# Altium footprint library CHIP.PcbLib: 86 footprints (part 1 of 6)
Each footprint in its own frame and in the unit in brackets; x right, y up, seen from the top. Pads: shape width x height; smd on the part's side, far side on the other; paste and mask are expansions set on the pad; w line width, h text height; cw(c..) or ccw(c..) is an arc to the next point about the centre after c.
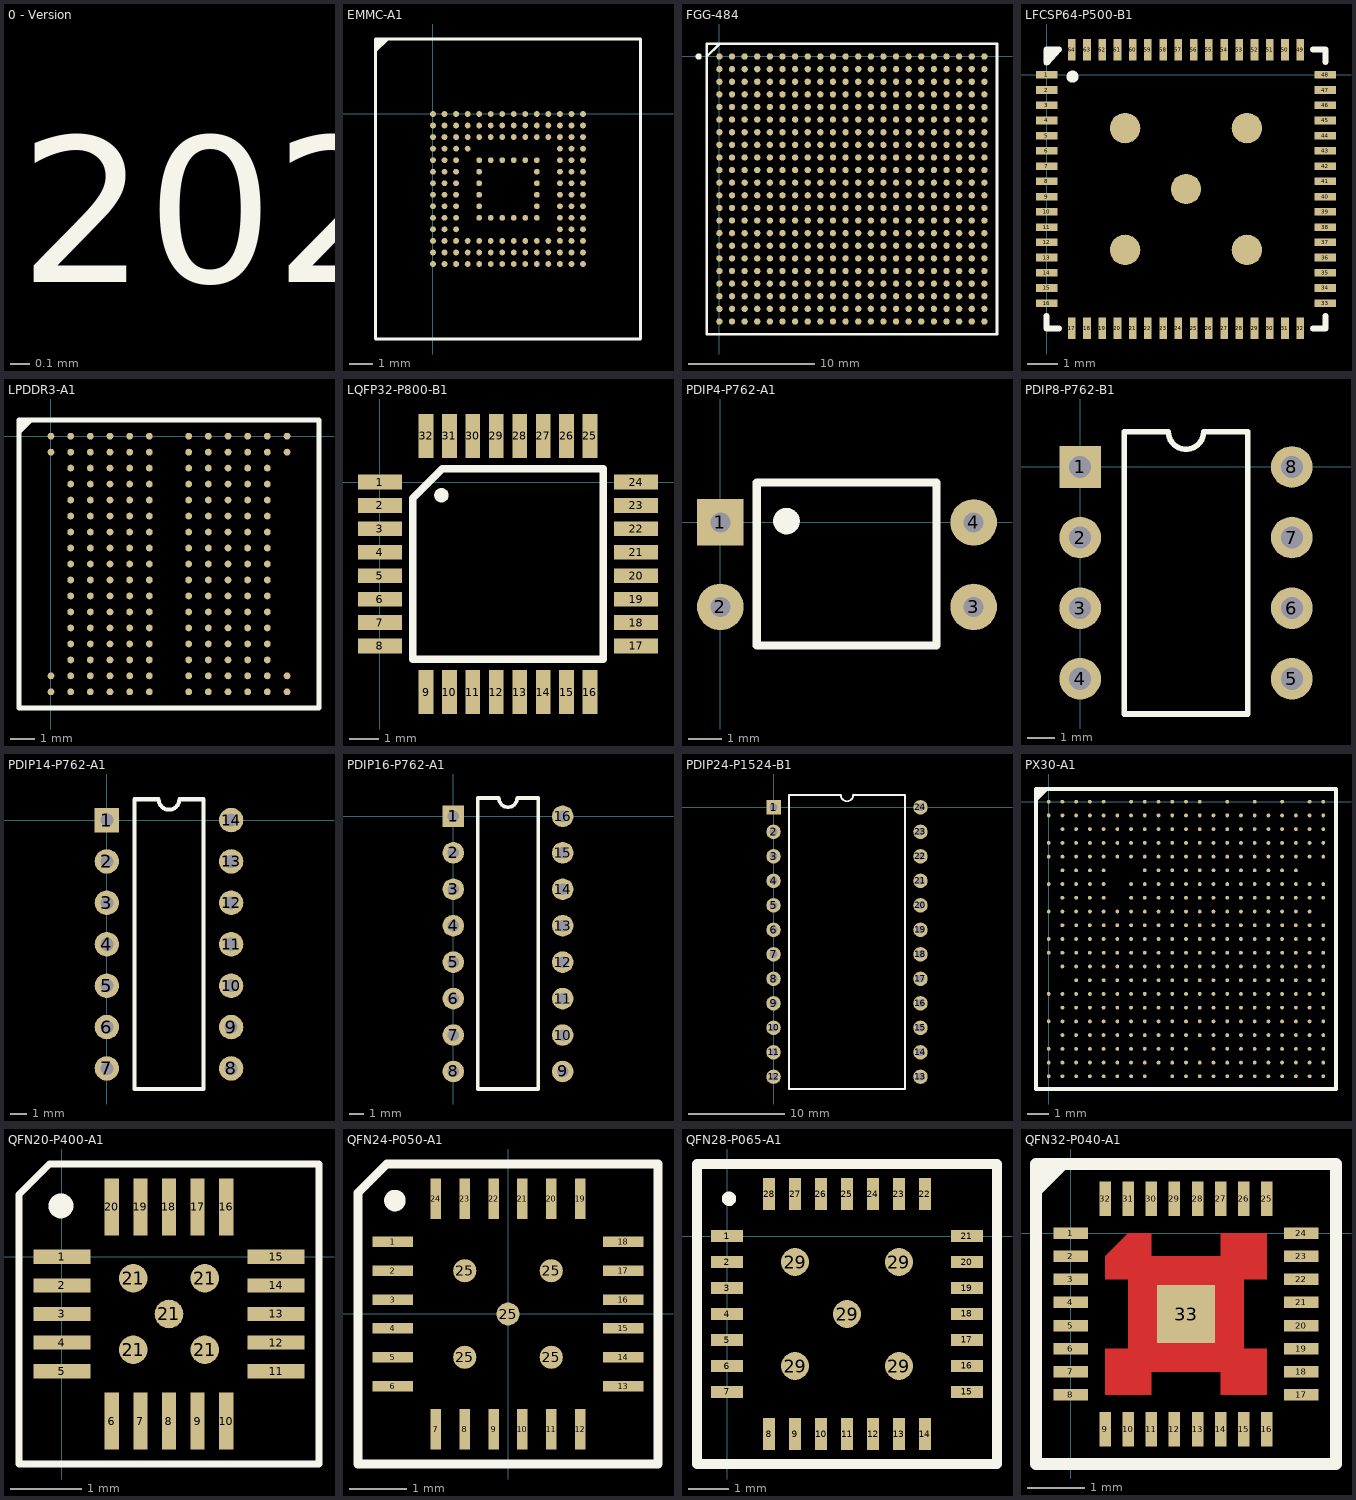
[diagram p0: the footprints below, top view; thin cyan lines are the x and y axes]

## 0 - Version [mm]
Top Overlay:
  text "CHIP / v1.0.4 / 2022/04/20" at -1263.5,-1267.925 h1.52

## EMMC-A1 [mm]
pads (153):
  round 0.25 smd mask+0.05: A1(0,0) A2(0.5,0) A3(1,0) A4(1.5,0) A5(2,0) A6(2.5,0) A7(3,0) A8(3.5,0) A9(4,0) A10(4.5,0) A11(5,0) A12(5.5,0) A13(6,0) A14(6.5,0) B1(0,-0.5) B2(0.5,-0.5) B3(1,-0.5) B4(1.5,-0.5) B5(2,-0.5) B6(2.5,-0.5) B7(3,-0.5) B8(3.5,-0.5) B9(4,-0.5) B10(4.5,-0.5) B11(5,-0.5) B12(5.5,-0.5) B13(6,-0.5) B14(6.5,-0.5) C1(0,-1) C2(0.5,-1) C3(1,-1) C4(1.5,-1) C5(2,-1) C6(2.5,-1) C7(3,-1) C8(3.5,-1) C9(4,-1) C10(4.5,-1) C11(5,-1) C12(5.5,-1) C13(6,-1) C14(6.5,-1) D1(0,-1.5) D2(0.5,-1.5) D3(1,-1.5) D4(1.5,-1.5) D12(5.5,-1.5) D13(6,-1.5) D14(6.5,-1.5) E1(0,-2) E2(0.5,-2) E3(1,-2) E5(2,-2) E6(2.5,-2) E7(3,-2) E8(3.5,-2) E9(4,-2) E10(4.5,-2) E12(5.5,-2) E13(6,-2) E14(6.5,-2) F1(0,-2.5) F2(0.5,-2.5) F3(1,-2.5) F5(2,-2.5) F10(4.5,-2.5) F12(5.5,-2.5) F13(6,-2.5) F14(6.5,-2.5) G1(0,-3) G2(0.5,-3) G3(1,-3) G5(2,-3) G10(4.5,-3) G12(5.5,-3) G13(6,-3) G14(6.5,-3) H1(0,-3.5) H2(0.5,-3.5) H3(1,-3.5) H5(2,-3.5) H10(4.5,-3.5) H12(5.5,-3.5) H13(6,-3.5) H14(6.5,-3.5) J1(0,-4) J2(0.5,-4) J3(1,-4) J5(2,-4) J10(4.5,-4) J12(5.5,-4) J13(6,-4) J14(6.5,-4) K1(0,-4.5) K2(0.5,-4.5) K3(1,-4.5) K5(2,-4.5) K6(2.5,-4.5) K7(3,-4.5) K8(3.5,-4.5) K9(4,-4.5) K10(4.5,-4.5) K12(5.5,-4.5) K13(6,-4.5) K14(6.5,-4.5) L1(0,-5) L2(0.5,-5) L3(1,-5) L12(5.5,-5) L13(6,-5) L14(6.5,-5) M1(0,-5.5) M2(0.5,-5.5) M3(1,-5.5) M4(1.5,-5.5) M5(2,-5.5) M6(2.5,-5.5) M7(3,-5.5) M8(3.5,-5.5) M9(4,-5.5) M10(4.5,-5.5) M11(5,-5.5) M12(5.5,-5.5) M13(6,-5.5) M14(6.5,-5.5) N1(0,-6) N2(0.5,-6) N3(1,-6) N4(1.5,-6) N5(2,-6) N6(2.5,-6) N7(3,-6) N8(3.5,-6) N9(4,-6) N10(4.5,-6) N11(5,-6) N12(5.5,-6) N13(6,-6) N14(6.5,-6) P1(0,-6.5) P2(0.5,-6.5) P3(1,-6.5) P4(1.5,-6.5) P5(2,-6.5) P6(2.5,-6.5) P7(3,-6.5) P8(3.5,-6.5) P9(4,-6.5) P10(4.5,-6.5) P11(5,-6.5) P12(5.5,-6.5) P13(6,-6.5) P14(6.5,-6.5)
Top Overlay:
  region: -2.5,3.25 -1.9,3.25 -2.5,2.65
  lines w0.127: -2.5,-9.75 -2.5,2.625 -2.5,2.75 -2.5,2.875 -2.5,3 -2.5,3.125 -2.5,3.25 -2.375,3.25 -2.25,3.25 -2.125,3.25 -2,3.25 -1.875,3.25 9,3.25 9,-9.75 -2.5,-9.75

## FGG-484 [mm]
pads (484):
  round 0.5 smd: A1(0.001,-0.001) A2(1,-0.001) A3(2,-0.001) A4(3,-0.001) A5(4,-0.001) A6(5,-0.001) A7(6,-0.001) A8(7.001,-0.001) A9(8.001,-0.001) A10(9.001,-0.001) A11(10.001,-0.001) A12(11.001,-0.001) A13(12.001,-0.001) A14(13,-0.001) A15(14,-0.001) A16(15,-0.001) A17(16,-0.001) A18(17,-0.001) A19(18,-0.001) A20(19.001,-0.001) A21(20.001,-0.001) A22(21.001,-0.001) AA1(0.001,-20.001) AA2(1,-20.001) AA3(2,-20.001) AA4(3,-20.001) AA5(4,-20.001) AA6(5,-20.001) AA7(6,-20.001) AA8(7.001,-20.001) AA9(8.001,-20.001) AA10(9.001,-20.001) AA11(10.001,-20.001) AA12(11.001,-20.001) AA13(12.001,-20.001) AA14(13,-20.001) AA15(14,-20.001) AA16(15,-20.001) AA17(16,-20.001) AA18(17,-20.001) AA19(18,-20.001) AA20(19.001,-20.001) AA21(20.001,-20.001) AA22(21.001,-20.001) AB1(0.001,-21.001) AB2(1,-21.001) AB3(2,-21.001) AB4(3,-21.001) AB5(4,-21.001) AB6(5,-21.001) AB7(6,-21.001) AB8(7.001,-21.001) AB9(8.001,-21.001) AB10(9.001,-21.001) AB11(10.001,-21.001) AB12(11.001,-21.001) AB13(12.001,-21.001) AB14(13,-21.001) AB15(14,-21.001) AB16(15,-21.001) AB17(16,-21.001) AB18(17,-21.001) AB19(18,-21.001) AB20(19.001,-21.001) AB21(20.001,-21.001) AB22(21.001,-21.001) B1(0.001,-1.001) B2(1,-1.001) B3(2,-1.001) B4(3,-1.001) B5(4,-1.001) B6(5,-1.001) B7(6,-1.001) B8(7.001,-1.001) B9(8.001,-1.001) B10(9.001,-1.001) B11(10.001,-1.001) B12(11.001,-1.001) B13(12.001,-1.001) B14(13,-1.001) B15(14,-1.001) B16(15,-1.001) B17(16,-1.001) B18(17,-1.001) B19(18,-1.001) B20(19.001,-1.001) B21(20.001,-1.001) B22(21.001,-1.001) C1(0.001,-2.001) C2(1,-2.001) C3(2,-2.001) C4(3,-2.001) C5(4,-2.001) C6(5,-2.001) C7(6,-2.001) C8(7.001,-2.001) C9(8.001,-2.001) C10(9.001,-2.001) C11(10.001,-2.001) C12(11.001,-2.001) C13(12.001,-2.001) C14(13,-2.001) C15(14,-2.001) C16(15,-2.001) C17(16,-2.001) C18(17,-2.001) C19(18,-2.001) C20(19.001,-2.001) C21(20.001,-2.001) C22(21.001,-2.001) D1(0.001,-3.001) D2(1,-3.001) D3(2,-3.001) D4(3,-3.001) D5(4,-3.001) D6(5,-3.001) D7(6,-3.001) D8(7.001,-3.001) D9(8.001,-3.001) D10(9.001,-3.001) D11(10.001,-3.001) D12(11.001,-3.001) D13(12.001,-3.001) D14(13,-3.001) D15(14,-3.001) D16(15,-3.001) D17(16,-3.001) D18(17,-3.001) D19(18,-3.001) D20(19.001,-3.001) D21(20.001,-3.001) D22(21.001,-3.001) E1(0.001,-4.001) E2(1,-4.001) E3(2,-4.001) E4(3,-4.001) E5(4,-4.001) E6(5,-4.001) E7(6,-4.001) E8(7.001,-4.001) E9(8.001,-4.001) E10(9.001,-4.001) E11(10.001,-4.001) E12(11.001,-4.001) E13(12.001,-4.001) E14(13,-4.001) E15(14,-4.001) E16(15,-4.001) E17(16,-4.001) E18(17,-4.001) E19(18,-4.001) E20(19.001,-4.001) E21(20.001,-4.001) E22(21.001,-4.001) F1(0.001,-5.001) F2(1,-5.001) F3(2,-5.001) F4(3,-5.001) F5(4,-5.001) F6(5,-5.001) F7(6,-5.001) F8(7.001,-5.001) F9(8.001,-5.001) F10(9.001,-5.001) F11(10.001,-5.001) F12(11.001,-5.001) F13(12.001,-5.001) F14(13,-5.001) F15(14,-5.001) F16(15,-5.001) F17(16,-5.001) F18(17,-5.001) F19(18,-5.001) F20(19.001,-5.001) F21(20.001,-5.001) F22(21.001,-5.001) G1(0.001,-6.001) G2(1,-6.001) G3(2,-6.001) G4(3,-6.001) G5(4,-6.001) G6(5,-6.001) G7(6,-6.001) G8(7.001,-6.001) G9(8.001,-6.001) G10(9.001,-6.001) G11(10.001,-6.001) G12(11.001,-6.001) G13(12.001,-6.001) G14(13,-6.001) G15(14,-6.001) G16(15,-6.001) G17(16,-6.001) G18(17,-6.001) G19(18,-6.001) G20(19.001,-6.001) G21(20.001,-6.001) G22(21.001,-6.001) H1(0.001,-7.001) H2(1,-7.001) H3(2,-7.001) H4(3,-7.001) H5(4,-7.001) H6(5,-7.001) H7(6,-7.001) H8(7.001,-7.001) H9(8.001,-7.001) H10(9.001,-7.001) H11(10.001,-7.001) H12(11.001,-7.001) H13(12.001,-7.001) H14(13,-7.001) H15(14,-7.001) H16(15,-7.001) H17(16,-7.001) H18(17,-7.001) H19(18,-7.001) H20(19.001,-7.001) H21(20.001,-7.001) H22(21.001,-7.001) J1(0.001,-8.001) J2(1,-8.001) J3(2,-8.001) J4(3,-8.001) J5(4,-8.001) J6(5,-8.001) J7(6,-8.001) J8(7.001,-8.001) J9(8.001,-8.001) J10(9.001,-8.001) J11(10.001,-8.001) J12(11.001,-8.001) J13(12.001,-8.001) J14(13,-8.001) J15(14,-8.001) J16(15,-8.001) J17(16,-8.001) J18(17,-8.001) J19(18,-8.001) J20(19.001,-8.001) J21(20.001,-8.001) J22(21.001,-8.001) K1(0.001,-9.001) K2(1,-9.001) K3(2,-9.001) K4(3,-9.001) K5(4,-9.001) K6(5,-9.001) K7(6,-9.001) K8(7.001,-9.001) K9(8.001,-9.001) K10(9.001,-9.001) K11(10.001,-9.001) K12(11.001,-9.001) K13(12.001,-9.001) K14(13,-9.001) K15(14,-9.001) K16(15,-9.001) K17(16,-9.001) K18(17,-9.001) K19(18,-9.001) K20(19.001,-9.001) K21(20.001,-9.001) K22(21.001,-9.001) L1(0.001,-10.001) L2(1,-10.001) L3(2,-10.001) L4(3,-10.001) L5(4,-10.001) L6(5,-10.001) L7(6,-10.001) L8(7.001,-10.001) L9(8.001,-10.001) L10(9.001,-10.001) L11(10.001,-10.001) L12(11.001,-10.001) L13(12.001,-10.001) L14(13,-10.001) L15(14,-10.001) L16(15,-10.001) L17(16,-10.001) L18(17,-10.001) L19(18,-10.001) L20(19.001,-10.001) L21(20.001,-10.001) L22(21.001,-10.001) M1(0.001,-11.001) M2(1,-11.001) M3(2,-11.001) M4(3,-11.001) M5(4,-11.001) M6(5,-11.001) M7(6,-11.001) M8(7.001,-11.001) M9(8.001,-11.001) M10(9.001,-11.001) M11(10.001,-11.001) M12(11.001,-11.001) M13(12.001,-11.001) M14(13,-11.001) M15(14,-11.001) M16(15,-11.001) M17(16,-11.001) M18(17,-11.001) M19(18,-11.001) M20(19.001,-11.001) M21(20.001,-11.001) M22(21.001,-11.001) N1(0.001,-12.001) N2(1,-12.001) N3(2,-12.001) N4(3,-12.001) N5(4,-12.001) N6(5,-12.001) N7(6,-12.001) N8(7.001,-12.001) N9(8.001,-12.001) N10(9.001,-12.001) N11(10.001,-12.001) N12(11.001,-12.001) N13(12.001,-12.001) N14(13,-12.001) N15(14,-12.001) N16(15,-12.001) N17(16,-12.001) N18(17,-12.001) N19(18,-12.001) N20(19.001,-12.001) N21(20.001,-12.001) N22(21.001,-12.001) P1(0.001,-13.001) P2(1,-13.001) P3(2,-13.001) P4(3,-13.001) P5(4,-13.001) P6(5,-13.001) P7(6,-13.001) P8(7.001,-13.001) P9(8.001,-13.001) P10(9.001,-13.001) P11(10.001,-13.001) P12(11.001,-13.001) P13(12.001,-13.001) P14(13,-13.001) P15(14,-13.001) P16(15,-13.001) P17(16,-13.001) P18(17,-13.001) P19(18,-13.001) P20(19.001,-13.001) P21(20.001,-13.001) P22(21.001,-13.001) R1(0.001,-14.001) R2(1,-14.001) R3(2,-14.001) R4(3,-14.001) R5(4,-14.001) R6(5,-14.001) R7(6,-14.001) R8(7.001,-14.001) R9(8.001,-14.001) R10(9.001,-14.001) R11(10.001,-14.001) R12(11.001,-14.001) R13(12.001,-14.001) R14(13,-14.001) R15(14,-14.001) R16(15,-14.001) R17(16,-14.001) R18(17,-14.001) R19(18,-14.001) R20(19.001,-14.001) R21(20.001,-14.001) R22(21.001,-14.001) T1(0.001,-15.001) T2(1,-15.001) T3(2,-15.001) T4(3,-15.001) T5(4,-15.001) T6(5,-15.001) T7(6,-15.001) T8(7.001,-15.001) T9(8.001,-15.001) T10(9.001,-15.001) T11(10.001,-15.001) T12(11.001,-15.001) T13(12.001,-15.001) T14(13,-15.001) T15(14,-15.001) T16(15,-15.001) T17(16,-15.001) T18(17,-15.001) T19(18,-15.001) T20(19.001,-15.001) T21(20.001,-15.001) T22(21.001,-15.001) U1(0.001,-16.001) U2(1,-16.001) U3(2,-16.001) U4(3,-16.001) U5(4,-16.001) U6(5,-16.001) U7(6,-16.001) U8(7.001,-16.001) U9(8.001,-16.001) U10(9.001,-16.001) U11(10.001,-16.001) U12(11.001,-16.001) U13(12.001,-16.001) U14(13,-16.001) U15(14,-16.001) U16(15,-16.001) U17(16,-16.001) U18(17,-16.001) U19(18,-16.001) U20(19.001,-16.001) U21(20.001,-16.001) U22(21.001,-16.001) V1(0.001,-17.001) V2(1,-17.001) V3(2,-17.001) V4(3,-17.001) V5(4,-17.001) V6(5,-17.001) V7(6,-17.001) V8(7.001,-17.001) V9(8.001,-17.001) V10(9.001,-17.001) V11(10.001,-17.001) V12(11.001,-17.001) V13(12.001,-17.001) V14(13,-17.001) V15(14,-17.001) V16(15,-17.001) V17(16,-17.001) V18(17,-17.001) V19(18,-17.001) V20(19.001,-17.001) V21(20.001,-17.001) V22(21.001,-17.001) W1(0.001,-18.001) W2(1,-18.001) W3(2,-18.001) W4(3,-18.001) W5(4,-18.001) W6(5,-18.001) W7(6,-18.001) W8(7.001,-18.001) W9(8.001,-18.001) W10(9.001,-18.001) W11(10.001,-18.001) W12(11.001,-18.001) W13(12.001,-18.001) W14(13,-18.001) W15(14,-18.001) W16(15,-18.001) W17(16,-18.001) W18(17,-18.001) W19(18,-18.001) W20(19.001,-18.001) W21(20.001,-18.001) W22(21.001,-18.001) Y1(0.001,-19.001) Y2(1,-19.001) Y3(2,-19.001) Y4(3,-19.001) Y5(4,-19.001) Y6(5,-19.001) Y7(6,-19.001) Y8(7.001,-19.001) Y9(8.001,-19.001) Y10(9.001,-19.001) Y11(10.001,-19.001) Y12(11.001,-19.001) Y13(12.001,-19.001) Y14(13,-19.001) Y15(14,-19.001) Y16(15,-19.001) Y17(16,-19.001) Y18(17,-19.001) Y19(18,-19.001) Y20(19.001,-19.001) Y21(20.001,-19.001) Y22(21.001,-19.001)
Top Overlay:
  circle w0.25: c-1.65,-0.001 r0.125
  lines w0.2: -0.999,-0.001 0.001,0.999 ; -0.999,-22.001 22.001,-22.001 22.001,0.999 -0.999,0.999 -0.999,-22.001

## LFCSP64-P500-B1 [mm]
height 0.85
pads (70):
  rect 0.7x0.25 smd: 1(0,0) 2(0,-0.5) 3(0,-1) 4(0,-1.5) 5(0,-2) 6(0,-2.5) 7(0,-3) 8(0,-3.5) 9(0,-4) 10(0,-4.5) 11(0,-5) 12(0,-5.5) 13(0,-6) 14(0,-6.5) 15(0,-7) 16(0,-7.5) 33(9.15,-7.5) 34(9.15,-7) 35(9.15,-6.5) 36(9.15,-6) 37(9.15,-5.5) 38(9.15,-5) 39(9.15,-4.5) 40(9.15,-4) 41(9.15,-3.5) 42(9.15,-3) 43(9.15,-2.5) 44(9.15,-2) 45(9.15,-1.5) 46(9.15,-1) 47(9.15,-0.5) 48(9.15,0)
  rect 0.25x0.7 smd: 17(0.825,-8.325) 18(1.325,-8.325) 19(1.825,-8.325) 20(2.325,-8.325) 21(2.825,-8.325) 22(3.325,-8.325) 23(3.825,-8.325) 24(4.325,-8.325) 25(4.825,-8.325) 26(5.325,-8.325) 27(5.825,-8.325) 28(6.325,-8.325) 29(6.825,-8.325) 30(7.325,-8.325) 31(7.825,-8.325) 32(8.325,-8.325) 49(8.325,0.825) 50(7.825,0.825) 51(7.325,0.825) 52(6.825,0.825) 53(6.325,0.825) 54(5.825,0.825) 55(5.325,0.825) 56(4.825,0.825) 57(4.325,0.825) 58(3.825,0.825) 59(3.325,0.825) 60(2.825,0.825) 61(2.325,0.825) 62(1.825,0.825) 63(1.325,0.825) 64(0.825,0.825)
  round 0.4 on Top Overlay paste+0: ""(0.85,-0.06)
  round 1 smd: ""(2.575,-5.75) ""(2.575,-1.75) ""(4.575,-3.75) ""(6.575,-5.75) ""(6.575,-1.75)
Top Overlay:
  lines w0.2: 0,-7.925 0,-8.325 0.4,-8.325 ; 0,0.825 0,0.4 0.4,0.83 0,0.83 ; 0.03,0.72 0.24,0.72 ; 8.75,-8.325 9.15,-8.325 9.15,-7.925 ; 8.75,0.825 9.15,0.825 9.15,0.425
3D body "AD5755-STEP.STEP": height 0.83, standoff -0.02, extent 0.075,-8.246 9.075,0.755

## LPDDR3-A1 [mm]
pads (178):
  round 0.275 smd mask+0.05: A1(0,0) A2(0.8,0) A3(1.6,0) A4(2.4,0) A5(3.2,0) A6(4,0) A8(5.6,0) A9(6.4,0) A10(7.2,0) A11(8,0) A12(8.8,0) A13(9.6,0) B1(0,-0.65) B2(0.8,-0.65) B3(1.6,-0.65) B4(2.4,-0.65) B5(3.2,-0.65) B6(4,-0.65) B8(5.6,-0.65) B9(6.4,-0.65) B10(7.2,-0.65) B11(8,-0.65) B12(8.8,-0.65) B13(9.6,-0.65) C2(0.8,-1.3) C3(1.6,-1.3) C4(2.4,-1.3) C5(3.2,-1.3) C6(4,-1.3) C8(5.6,-1.3) C9(6.4,-1.3) C10(7.2,-1.3) C11(8,-1.3) C12(8.8,-1.3) D2(0.8,-1.95) D3(1.6,-1.95) D4(2.4,-1.95) D5(3.2,-1.95) D6(4,-1.95) D8(5.6,-1.95) D9(6.4,-1.95) D10(7.2,-1.95) D11(8,-1.95) D12(8.8,-1.95) E2(0.8,-2.6) E3(1.6,-2.6) E4(2.4,-2.6) E5(3.2,-2.6) E6(4,-2.6) E8(5.6,-2.6) E9(6.4,-2.6) E10(7.2,-2.6) E11(8,-2.6) E12(8.8,-2.6) F2(0.8,-3.25) F3(1.6,-3.25) F4(2.4,-3.25) F5(3.2,-3.25) F6(4,-3.25) F8(5.6,-3.25) F9(6.4,-3.25) F10(7.2,-3.25) F11(8,-3.25) F12(8.8,-3.25) G2(0.8,-3.9) G3(1.6,-3.9) G4(2.4,-3.9) G5(3.2,-3.9) G6(4,-3.9) G8(5.6,-3.9) G9(6.4,-3.9) G10(7.2,-3.9) G11(8,-3.9) G12(8.8,-3.9) H2(0.8,-4.55) H3(1.6,-4.55) H4(2.4,-4.55) H5(3.2,-4.55) H6(4,-4.55) H8(5.6,-4.55) H9(6.4,-4.55) H10(7.2,-4.55) H11(8,-4.55) H12(8.8,-4.55) J2(0.8,-5.2) J3(1.6,-5.2) J4(2.4,-5.2) J5(3.2,-5.2) J6(4,-5.2) J8(5.6,-5.2) J9(6.4,-5.2) J10(7.2,-5.2) J11(8,-5.2) J12(8.8,-5.2) K2(0.8,-5.85) K3(1.6,-5.85) K4(2.4,-5.85) K5(3.2,-5.85) K6(4,-5.85) K8(5.6,-5.85) K9(6.4,-5.85) K10(7.2,-5.85) K11(8,-5.85) K12(8.8,-5.85) L2(0.8,-6.5) L3(1.6,-6.5) L4(2.4,-6.5) L5(3.2,-6.5) L6(4,-6.5) L8(5.6,-6.5) L9(6.4,-6.5) L10(7.2,-6.5) L11(8,-6.5) L12(8.8,-6.5) M2(0.8,-7.15) M3(1.6,-7.15) M4(2.4,-7.15) M5(3.2,-7.15) M6(4,-7.15) M8(5.6,-7.15) M9(6.4,-7.15) M10(7.2,-7.15) M11(8,-7.15) M12(8.8,-7.15) N2(0.8,-7.8) N3(1.6,-7.8) N4(2.4,-7.8) N5(3.2,-7.8) N6(4,-7.8) N8(5.6,-7.8) N9(6.4,-7.8) N10(7.2,-7.8) N11(8,-7.8) N12(8.8,-7.8) P2(0.8,-8.45) P3(1.6,-8.45) P4(2.4,-8.45) P5(3.2,-8.45) P6(4,-8.45) P8(5.6,-8.45) P9(6.4,-8.45) P10(7.2,-8.45) P11(8,-8.45) P12(8.8,-8.45) R2(0.8,-9.1) R3(1.6,-9.1) R4(2.4,-9.1) R5(3.2,-9.1) R6(4,-9.1) R8(5.6,-9.1) R9(6.4,-9.1) R10(7.2,-9.1) R11(8,-9.1) R12(8.8,-9.1) T1(0,-9.75) T2(0.8,-9.75) T3(1.6,-9.75) T4(2.4,-9.75) T5(3.2,-9.75) T6(4,-9.75) T8(5.6,-9.75) T9(6.4,-9.75) T10(7.2,-9.75) T11(8,-9.75) T12(8.8,-9.75) T13(9.6,-9.75) U1(0,-10.4) U2(0.8,-10.4) U3(1.6,-10.4) U4(2.4,-10.4) U5(3.2,-10.4) U6(4,-10.4) U8(5.6,-10.4) U9(6.4,-10.4) U10(7.2,-10.4) U11(8,-10.4) U12(8.8,-10.4) U13(9.6,-10.4)
Top Overlay:
  region: -1.3,0.65 -0.7,0.65 -1.3,0.05
  lines w0.2: -1.3,-11.05 10.9,-11.05 10.9,0.65 -1.3,0.65 -1.3,-11.05

## LQFP32-P800-B1 [mm]
pads (33):
  rect 1.5x0.5 smd: 1(0,0) 2(0,-0.8) 3(0,-1.6) 4(0,-2.4) 5(0,-3.2) 6(0,-4) 7(0,-4.8) 8(0,-5.6) 17(8.75,-5.6) 18(8.75,-4.8) 19(8.75,-4) 20(8.75,-3.2) 21(8.75,-2.4) 22(8.75,-1.6) 23(8.75,-0.8) 24(8.75,0)
  rect 0.5x1.5 smd: 9(1.575,-7.175) 10(2.375,-7.175) 11(3.175,-7.175) 12(3.975,-7.175) 13(4.775,-7.175) 14(5.575,-7.175) 15(6.375,-7.175) 16(7.175,-7.175) 25(7.175,1.575) 26(6.375,1.575) 27(5.575,1.575) 28(4.775,1.575) 29(3.975,1.575) 30(3.175,1.575) 31(2.375,1.575) 32(1.575,1.575)
  round 0.5 on Top Overlay: ""(2.1,-0.45)
Top Overlay:
  lines w0.25: 1.125,-6.05 7.625,-6.05 7.625,0.45 2.125,0.45 1.125,-0.55 1.125,-6.05
3D body "User Library-LQFP32-2.STEP": height 1.62, standoff -0.01, extent -0.166,-7.378 8.978,1.766

## PDIP4-P762-A1 [mm]
height 3.7
pads (4):
  rect 1.4x1.4 hole 0.6: 1(0,0)
  round 1.4 hole 0.6: 2(0,-2.54) 3(7.62,-2.54) 4(7.62,0)
Top Overlay:
  circle w0.4: c1.99,0.04 r0.2
  lines w0.25: 1.1,-3.7 6.5,-3.7 6.5,1.2 1.1,1.2 1.1,-3.7
3D body "PC817.STEP": height 4.3, standoff -3.1, extent -0.129,-3.55 7.729,1.03

## PDIP8-P762-B1 [mm]
pads (8):
  rect 1.5x1.5 hole 0.8: 1(0,0)
  round 1.5 hole 0.8: 2(0,-2.54) 3(0,-5.08) 4(0,-7.62) 5(7.62,-7.62) 6(7.62,-5.08) 7(7.62,-2.54) 8(7.62,0)
Top Overlay:
  lines w0.2: 1.585,-8.89 1.585,1.27 3.175,1.27 ccw(c3.81,1.27) 4.445,1.27 6.035,1.27 6.035,-8.89 1.585,-8.89
3D body "User Library-PDIP-8.STEP": height 5.1, standoff -3.18, extent -0.33,-8.8 7.93,1.2

## PDIP14-P762-A1 [mm]
pads (14):
  rect 1.5x1.5 hole 0.8: 1(-0.001,0)
  round 1.5 hole 0.8: 2(-0.001,-2.54) 3(-0.001,-5.08) 4(-0.001,-7.62) 5(-0.001,-10.16) 6(-0.001,-12.7) 7(-0.001,-15.24) 8(7.619,-15.24) 9(7.619,-12.7) 10(7.619,-10.16) 11(7.619,-7.62) 12(7.619,-5.08) 13(7.619,-2.54) 14(7.619,0)
Top Overlay:
  lines w0.25: 1.699,1.27 1.699,-16.5 5.92,-16.5 5.92,1.27 ; 1.699,1.275 3.174,1.275 ; 3.174,1.27 ccw(c3.809,1.27) 4.444,1.27 ; 4.45,1.275 5.92,1.275
3D body "SW3DPS-DIP-14-DEFAULT.STEP": height 3.51, standoff -3.47, extent -0.212,-17.133 7.788,1.917

## PDIP16-P762-A1 [mm]
pads (16):
  rect 1.5x1.5 hole 0.8: 1(0,-0.002)
  round 1.5 hole 0.8: 2(0,-2.542) 3(0,-5.082) 4(0,-7.622) 5(0,-10.162) 6(0,-12.702) 7(0,-15.242) 8(0,-17.782) 9(7.62,-17.782) 10(7.62,-15.242) 11(7.62,-12.702) 12(7.62,-10.162) 13(7.62,-7.622) 14(7.62,-5.082) 15(7.62,-2.542) 16(7.62,-0.002)
Top Overlay:
  lines w0.25: 1.7,1.268 1.7,-19.002 5.92,-19.002 5.92,1.268 ; 1.7,1.273 3.175,1.273 ; 3.175,1.268 ccw(c3.81,1.268) 4.445,1.268 ; 4.45,1.273 5.92,1.273
3D body "SW3DPS-DIP 16 IC-DEFAULT.STEP": height 5.1, standoff -3.3, extent -0.051,-18.65 7.819,1.35

## PDIP24-P1524-B1 [mm]
pads (24):
  rect 1.5x1.5 hole 0.8: 1(0,0)
  round 1.5 hole 0.8: 2(0,-2.54) 3(0,-5.08) 4(0,-7.62) 5(0,-10.16) 6(0,-12.7) 7(0,-15.24) 8(0,-17.78) 9(0,-20.32) 10(0,-22.86) 11(0,-25.4) 12(0,-27.94) 13(15.24,-27.94) 14(15.24,-25.4) 15(15.24,-22.86) 16(15.24,-20.32) 17(15.24,-17.78) 18(15.24,-15.24) 19(15.24,-12.7) 20(15.24,-10.16) 21(15.24,-7.62) 22(15.24,-5.08) 23(15.24,-2.54) 24(15.24,0)
Top Overlay:
  lines w0.2: 1.585,-29.21 13.655,-29.21 13.655,1.27 8.255,1.27 cw(c7.62,1.27) 6.985,1.27 1.585,1.27 1.585,-29.21
3D body "User Library-DIP24 Wide.STEP": height 5.09, standoff -3.81, extent -0.12,-30.13 15.32,2.13

## PX30-A1 [mm]
pads (418):
  round 0.18 smd mask+0.05: A1(0,0) A2(0.65,0) A3(1.3,0) A4(1.95,0) A5(2.6,0) A7(3.9,0) A8(4.55,0) A9(5.2,0) A10(5.85,0) A11(6.5,0) A12(7.15,0) A14(8.45,0) A16(9.75,0) A18(11.05,0) A20(12.35,0) A21(13,0) AA1(0,-13) AA2(0.65,-13) AA3(1.3,-13) AA4(1.95,-13) AA5(2.6,-13) AA6(3.25,-13) AA7(3.9,-13) AA8(4.55,-13) AA10(5.85,-13) AA11(6.5,-13) AA12(7.15,-13) AA13(7.8,-13) AA14(8.45,-13) AA15(9.1,-13) AA16(9.75,-13) AA17(10.4,-13) AA18(11.05,-13) AA19(11.7,-13) AA20(12.35,-13) AA21(13,-13) B1(0,-0.65) B2(0.65,-0.65) B3(1.3,-0.65) B4(1.95,-0.65) B5(2.6,-0.65) B6(3.25,-0.65) B7(3.9,-0.65) B8(4.55,-0.65) B9(5.2,-0.65) B10(5.85,-0.65) B11(6.5,-0.65) B12(7.15,-0.65) B13(7.8,-0.65) B14(8.45,-0.65) B15(9.1,-0.65) B16(9.75,-0.65) B17(10.4,-0.65) B18(11.05,-0.65) B19(11.7,-0.65) B20(12.35,-0.65) B21(13,-0.65) C2(0.65,-1.3) C3(1.3,-1.3) C4(1.95,-1.3) C5(2.6,-1.3) C6(3.25,-1.3) C7(3.9,-1.3) C8(4.55,-1.3) C9(5.2,-1.3) C10(5.85,-1.3) C11(6.5,-1.3) C12(7.15,-1.3) C13(7.8,-1.3) C14(8.45,-1.3) C15(9.1,-1.3) C16(9.75,-1.3) C17(10.4,-1.3) C18(11.05,-1.3) C19(11.7,-1.3) C20(12.35,-1.3) C21(13,-1.3) D1(0,-1.95) D2(0.65,-1.95) D3(1.3,-1.95) D4(1.95,-1.95) D5(2.6,-1.95) D6(3.25,-1.95) D7(3.9,-1.95) D8(4.55,-1.95) D9(5.2,-1.95) D10(5.85,-1.95) D11(6.5,-1.95) D12(7.15,-1.95) D13(7.8,-1.95) D14(8.45,-1.95) D15(9.1,-1.95) D16(9.75,-1.95) D17(10.4,-1.95) D18(11.05,-1.95) D19(11.7,-1.95) D20(12.35,-1.95) D21(13,-1.95) E1(0,-2.6) E2(0.65,-2.6) E3(1.3,-2.6) E4(1.95,-2.6) E5(2.6,-2.6) E6(3.25,-2.6) E7(3.9,-2.6) E8(4.55,-2.6) E9(5.2,-2.6) E10(5.85,-2.6) E11(6.5,-2.6) E12(7.15,-2.6) E13(7.8,-2.6) E14(8.45,-2.6) E15(9.1,-2.6) E16(9.75,-2.6) E17(10.4,-2.6) E18(11.05,-2.6) E19(11.7,-2.6) E20(12.35,-2.6) E21(13,-2.6) F2(0.65,-3.25) F3(1.3,-3.25) F4(1.95,-3.25) F5(2.6,-3.25) F8(4.55,-3.25) F9(5.2,-3.25) F10(5.85,-3.25) F11(6.5,-3.25) F12(7.15,-3.25) F13(7.8,-3.25) F14(8.45,-3.25) F15(9.1,-3.25) F16(9.75,-3.25) F17(10.4,-3.25) F18(11.05,-3.25) F19(11.7,-3.25) G1(0,-3.9) G2(0.65,-3.9) G3(1.3,-3.9) G4(1.95,-3.9) G5(2.6,-3.9) G7(3.9,-3.9) G8(4.55,-3.9) G9(5.2,-3.9) G10(5.85,-3.9) G11(6.5,-3.9) G12(7.15,-3.9) G13(7.8,-3.9) G14(8.45,-3.9) G15(9.1,-3.9) G16(9.75,-3.9) G17(10.4,-3.9) G18(11.05,-3.9) G19(11.7,-3.9) G20(12.35,-3.9) G21(13,-3.9) H2(0.65,-4.55) H3(1.3,-4.55) H4(1.95,-4.55) H5(2.6,-4.55) H7(3.9,-4.55) H8(4.55,-4.55) H9(5.2,-4.55) H10(5.85,-4.55) H11(6.5,-4.55) H12(7.15,-4.55) H13(7.8,-4.55) H14(8.45,-4.55) H15(9.1,-4.55) H16(9.75,-4.55) H17(10.4,-4.55) H18(11.05,-4.55) H19(11.7,-4.55) H20(12.35,-4.55) H21(13,-4.55) J1(0,-5.2) J2(0.65,-5.2) J3(1.3,-5.2) J4(1.95,-5.2) J5(2.6,-5.2) J6(3.25,-5.2) J7(3.9,-5.2) J8(4.55,-5.2) J9(5.2,-5.2) J10(5.85,-5.2) J11(6.5,-5.2) J12(7.15,-5.2) J13(7.8,-5.2) J14(8.45,-5.2) J15(9.1,-5.2) J16(9.75,-5.2) J17(10.4,-5.2) J18(11.05,-5.2) J19(11.7,-5.2) J20(12.35,-5.2) K2(0.65,-5.85) K3(1.3,-5.85) K4(1.95,-5.85) K5(2.6,-5.85) K6(3.25,-5.85) K7(3.9,-5.85) K8(4.55,-5.85) K9(5.2,-5.85) K10(5.85,-5.85) K11(6.5,-5.85) K12(7.15,-5.85) K13(7.8,-5.85) K14(8.45,-5.85) K15(9.1,-5.85) K16(9.75,-5.85) K17(10.4,-5.85) K18(11.05,-5.85) K19(11.7,-5.85) K20(12.35,-5.85) K21(13,-5.85) L1(0,-6.5) L2(0.65,-6.5) L3(1.3,-6.5) L4(1.95,-6.5) L5(2.6,-6.5) L6(3.25,-6.5) L7(3.9,-6.5) L8(4.55,-6.5) L9(5.2,-6.5) L10(5.85,-6.5) L11(6.5,-6.5) L12(7.15,-6.5) L13(7.8,-6.5) L14(8.45,-6.5) L15(9.1,-6.5) L16(9.75,-6.5) L17(10.4,-6.5) L18(11.05,-6.5) L19(11.7,-6.5) L20(12.35,-6.5) L21(13,-6.5) M1(0,-7.15) M2(0.65,-7.15) M3(1.3,-7.15) M4(1.95,-7.15) M5(2.6,-7.15) M6(3.25,-7.15) M7(3.9,-7.15) M8(4.55,-7.15) M9(5.2,-7.15) M10(5.85,-7.15) M11(6.5,-7.15) M12(7.15,-7.15) M13(7.8,-7.15) M14(8.45,-7.15) M15(9.1,-7.15) M16(9.75,-7.15) M17(10.4,-7.15) M18(11.05,-7.15) M19(11.7,-7.15) M20(12.35,-7.15) M21(13,-7.15) N2(0.65,-7.8) N3(1.3,-7.8) N4(1.95,-7.8) N5(2.6,-7.8) N6(3.25,-7.8) N7(3.9,-7.8) N8(4.55,-7.8) N9(5.2,-7.8) N10(5.85,-7.8) N11(6.5,-7.8) N12(7.15,-7.8) N13(7.8,-7.8) N14(8.45,-7.8) N15(9.1,-7.8) N16(9.75,-7.8) N17(10.4,-7.8) N18(11.05,-7.8) N19(11.7,-7.8) N20(12.35,-7.8) N21(13,-7.8) P3(1.3,-8.45) P4(1.95,-8.45) P5(2.6,-8.45) P6(3.25,-8.45) P7(3.9,-8.45) P8(4.55,-8.45) P9(5.2,-8.45) P10(5.85,-8.45) P11(6.5,-8.45) P12(7.15,-8.45) P13(7.8,-8.45) P14(8.45,-8.45) P15(9.1,-8.45) P16(9.75,-8.45) P17(10.4,-8.45) P18(11.05,-8.45) P19(11.7,-8.45) P20(12.35,-8.45) P21(13,-8.45) R1(0,-9.1) R2(0.65,-9.1) R3(1.3,-9.1) R4(1.95,-9.1) R5(2.6,-9.1) R6(3.25,-9.1) R7(3.9,-9.1) R8(4.55,-9.1) R9(5.2,-9.1) R10(5.85,-9.1) R11(6.5,-9.1) R12(7.15,-9.1) R13(7.8,-9.1) R14(8.45,-9.1) R15(9.1,-9.1) R16(9.75,-9.1) R17(10.4,-9.1) R18(11.05,-9.1) R19(11.7,-9.1) R20(12.35,-9.1) R21(13,-9.1) T2(0.65,-9.75) T3(1.3,-9.75) T4(1.95,-9.75) T5(2.6,-9.75) T6(3.25,-9.75) T7(3.9,-9.75) T8(4.55,-9.75) T9(5.2,-9.75) T10(5.85,-9.75) T11(6.5,-9.75) T12(7.15,-9.75) T13(7.8,-9.75) T14(8.45,-9.75) T15(9.1,-9.75) T16(9.75,-9.75) T17(10.4,-9.75) T18(11.05,-9.75) T19(11.7,-9.75) T20(12.35,-9.75) T21(13,-9.75) U1(0,-10.4) U2(0.65,-10.4) U3(1.3,-10.4) U4(1.95,-10.4) U5(2.6,-10.4) U6(3.25,-10.4) U7(3.9,-10.4) U8(4.55,-10.4) U9(5.2,-10.4) U10(5.85,-10.4) U11(6.5,-10.4) U12(7.15,-10.4) U13(7.8,-10.4) U14(8.45,-10.4) U15(9.1,-10.4) U16(9.75,-10.4) U17(10.4,-10.4) U18(11.05,-10.4) U19(11.7,-10.4) U20(12.35,-10.4) U21(13,-10.4) V2(0.65,-11.05) V3(1.3,-11.05) V4(1.95,-11.05) V5(2.6,-11.05) V6(3.25,-11.05) V7(3.9,-11.05) V8(4.55,-11.05) V9(5.2,-11.05) V10(5.85,-11.05) V11(6.5,-11.05) V12(7.15,-11.05) V13(7.8,-11.05) V14(8.45,-11.05) V15(9.1,-11.05) V16(9.75,-11.05) V17(10.4,-11.05) V18(11.05,-11.05) V19(11.7,-11.05) V20(12.35,-11.05) V21(13,-11.05) W1(0,-11.7) W2(0.65,-11.7) W3(1.3,-11.7) W4(1.95,-11.7) W5(2.6,-11.7) W6(3.25,-11.7) W7(3.9,-11.7) W8(4.55,-11.7) W9(5.2,-11.7) W10(5.85,-11.7) W11(6.5,-11.7) W13(7.8,-11.7) W14(8.45,-11.7) W15(9.1,-11.7) W16(9.75,-11.7) W17(10.4,-11.7) W18(11.05,-11.7) W19(11.7,-11.7) W20(12.35,-11.7) W21(13,-11.7) Y1(0,-12.35) Y2(0.65,-12.35) Y3(1.3,-12.35) Y4(1.95,-12.35) Y5(2.6,-12.35) Y6(3.25,-12.35) Y7(3.9,-12.35) Y8(4.55,-12.35) Y9(5.2,-12.35) Y10(5.85,-12.35) Y11(6.5,-12.35) Y12(7.15,-12.35) Y13(7.8,-12.35) Y14(8.45,-12.35) Y15(9.1,-12.35) Y16(9.75,-12.35) Y17(10.4,-12.35) Y18(11.05,-12.35) Y19(11.7,-12.35) Y20(12.35,-12.35) Y21(13,-12.35)
Top Overlay:
  region: -0.6,0.6 0,0.6 -0.6,0
  lines w0.2: -0.6,-13.6 -0.6,0.6 13.6,0.6 13.6,-13.6 -0.6,-13.6

## QFN20-P400-A1 [mm]
pads (25):
  rect 0.8x0.2 smd: 1(0,0) 2(0,-0.4) 3(0,-0.8) 4(0,-1.2) 5(0,-1.6) 11(3,-1.6) 12(3,-1.2) 13(3,-0.8) 14(3,-0.4) 15(3,0)
  rect 0.2x0.8 smd: 6(0.7,-2.3) 7(1.1,-2.3) 8(1.5,-2.3) 9(1.9,-2.3) 10(2.3,-2.3) 16(2.3,0.7) 17(1.9,0.7) 18(1.5,0.7) 19(1.1,0.7) 20(0.7,0.7)
  round 0.4 smd: 21(1,-1.3) 21(1,-0.3) 21(1.5,-0.8) 21(2,-1.3) 21(2,-0.3)
Top Overlay:
  circle w0.254: c-0.014,0.714 r0.047
  lines w0.1: -0.6,-2.9 3.6,-2.9 3.6,1.3 -0.173,1.3 -0.6,0.873 -0.6,-2.9
3D body "User Library-QFN-20-2.STEP": height 0.75, standoff 0, extent -0.019,-2.307 3.001,0.713

## QFN24-P050-A1 [mm]
pads (29):
  rect 0.7x0.18 smd: 1(-2.001,1.25) 2(-2.001,0.75) 3(-2.001,0.25) 4(-2.001,-0.25) 5(-2.001,-0.75) 6(-2.001,-1.25) 13(1.999,-1.25) 14(1.999,-0.75) 15(1.999,-0.25) 16(1.999,0.25) 17(1.999,0.75) 18(1.999,1.25)
  rect 0.18x0.7 smd: 7(-1.251,-2) 8(-0.751,-2) 9(-0.251,-2) 10(0.249,-2) 11(0.749,-2) 12(1.249,-2) 19(1.249,2) 20(0.749,2) 21(0.249,2) 22(-0.251,2) 23(-0.751,2) 24(-1.251,2)
  round 0.4 smd: 25(-0.751,-0.75) 25(-0.751,0.75) 25(0,0) 25(0.749,-0.75) 25(0.749,0.75)
Top Overlay:
  circle w0.254: c-1.96,1.966 r0.059
  lines w0.15: -2.601,-2.6 2.599,-2.6 2.599,2.6 -2.101,2.6 -2.601,2.1 -2.601,-2.6

## QFN28-P065-A1 [mm] "dsPIC33　PITCH:0.65"
height 0.9
pads (33):
  rect 0.8x0.3 smd: 1(0,0) 2(0,-0.65) 3(0,-1.3) 4(0,-1.95) 5(0,-2.6) 6(0,-3.25) 7(0,-3.9) 15(6,-3.9) 16(6,-3.25) 17(6,-2.6) 18(6,-1.95) 19(6,-1.3) 20(6,-0.65) 21(6,0)
  rect 0.3x0.8 smd: 8(1.05,-4.95) 9(1.7,-4.95) 10(2.35,-4.95) 11(3,-4.95) 12(3.65,-4.95) 13(4.3,-4.95) 14(4.95,-4.95) 22(4.95,1.05) 23(4.3,1.05) 24(3.65,1.05) 25(3,1.05) 26(2.35,1.05) 27(1.7,1.05) 28(1.05,1.05)
  round 0.7 smd: 29(1.7,-3.25) 29(1.7,-0.65) 29(3,-1.95) 29(4.3,-3.25) 29(4.3,-0.65)
Top Overlay:
  circle w0.254: c0.05,0.93 r0.051
  lines w0.25: -0.75,-5.7 6.75,-5.7 6.75,1.8 -0.75,1.8 -0.75,-5.7
3D body "SW3dPS-QFN-28.STEP": height 1.02, standoff -0.08, extent -0.01,-4.95 5.99,1.05

## QFN32-P040-A1 [mm]
pads (33):
  rect 0.6x0.2 smd: 1(0,0) 2(0,-0.4) 3(0,-0.8) 4(0,-1.2) 5(0,-1.6) 6(0,-2) 7(0,-2.4) 8(0,-2.8) 17(4,-2.8) 18(4,-2.4) 19(4,-2) 20(4,-1.6) 21(4,-1.2) 22(4,-0.8) 23(4,-0.4) 24(4,0)
  rect 0.2x0.6 smd: 9(0.6,-3.4) 10(1,-3.4) 11(1.4,-3.4) 12(1.8,-3.4) 13(2.2,-3.4) 14(2.6,-3.4) 15(3,-3.4) 16(3.4,-3.4) 25(3.4,0.6) 26(3,0.6) 27(2.6,0.6) 28(2.2,0.6) 29(1.8,0.6) 30(1.4,0.6) 31(1,0.6) 32(0.6,0.6)
  rect 1x1 smd: 33(2,-1.4)
Top Layer:
  region: 0.6,0
  region: 0.8,-0.2 1,0 1.4,0 1.4,-0.4 2.6,-0.4 2.6,0 3.4,0 3.4,-0.8 3,-0.8 3,-2 3.4,-2 3.4,-2.8 2.6,-2.8 2.6,-2.4 1.4,-2.4 1.4,-2.8 0.6,-2.8 0.6,-2 1,-2 1,-0.8 0.6,-0.8 0.6,-0.4
Top Overlay:
  region: -0.6,1.2 0,1.2 -0.6,0.6
  lines w0.2: -0.6,-4 4.6,-4 4.6,1.2 -0.6,1.2 -0.6,-4
Top Solder:
  region: 0.95,0.1 1.5,0.1 1.5,-0.3 2.5,-0.3 2.5,0.1 3.5,0.1 3.5,-0.9 3.1,-0.9 3.1,-1.9 3.5,-1.9 3.5,-2.9 2.5,-2.9 2.5,-2.5 1.5,-2.5 1.5,-2.9 0.5,-2.9 0.5,-1.9 0.9,-1.9 0.9,-0.9 0.5,-0.9 0.5,-0.35